# Altium footprint library Supernova.PcbLib: 77 footprints (part 2 of 6)
Each footprint in its own frame and in the unit in brackets; x right, y up, seen from the top. Pads: shape width x height; smd on the part's side, far side on the other; paste and mask are expansions set on the pad; w line width, h text height; cw(c..) or ccw(c..) is an arc to the next point about the centre after c.
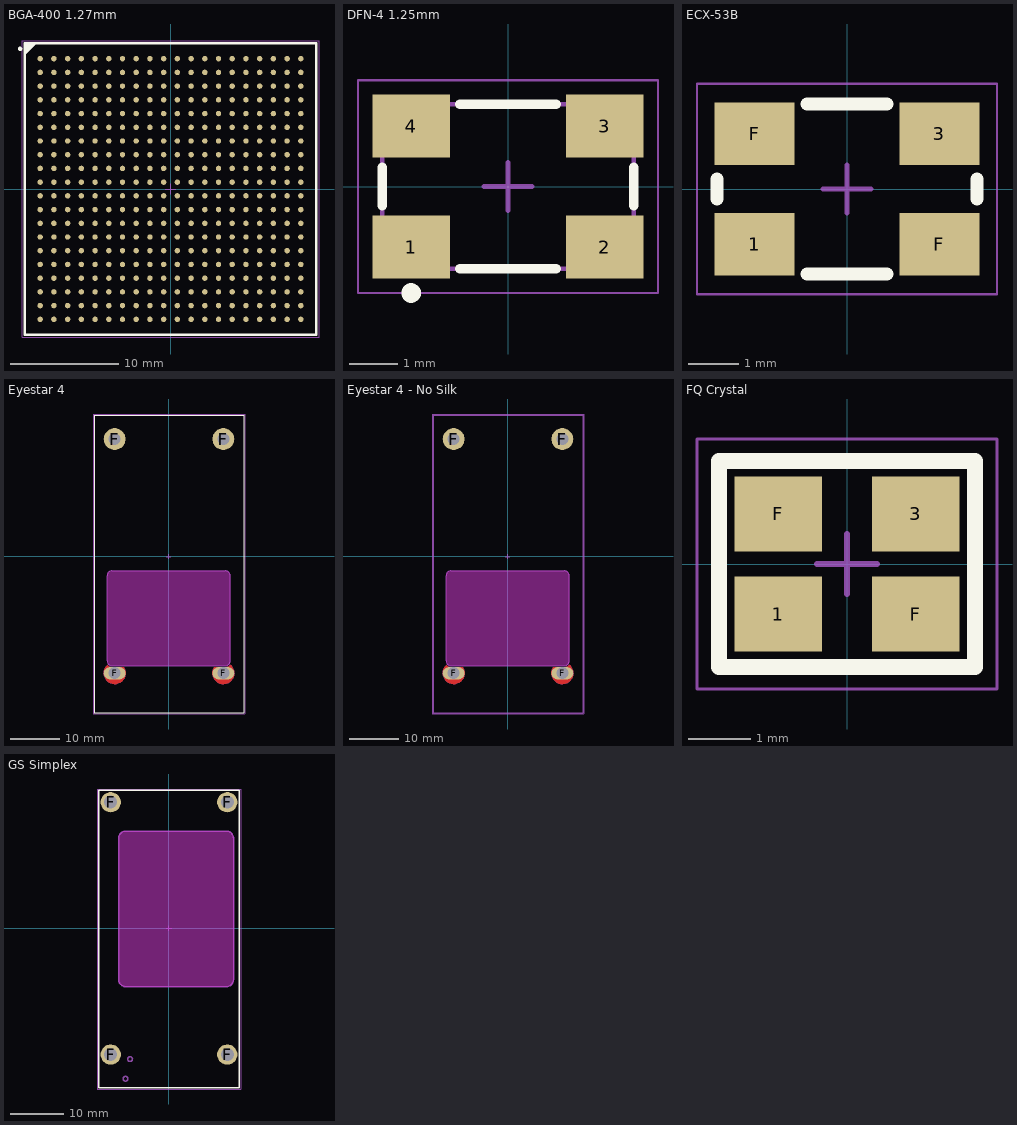
[diagram p1: the footprints below, top view; thin cyan lines are the x and y axes]

## BGA-400 1.27mm [mm] "BGA, 400-Leads, Body 27.00x27.00mmx2.60mm, Pitch 1.27mm"
height 2.6
pads (400):
  round 0.5 smd paste-0.04 mask+0.05: A1(-12.065,12.065) A2(-10.795,12.065) A3(-9.525,12.065) A4(-8.255,12.065) A5(-6.985,12.065) A6(-5.715,12.065) A7(-4.445,12.065) A8(-3.175,12.065) A9(-1.905,12.065) A10(-0.635,12.065) A11(0.635,12.065) A12(1.905,12.065) A13(3.175,12.065) A14(4.445,12.065) A15(5.715,12.065) A16(6.985,12.065) A17(8.255,12.065) A18(9.525,12.065) A19(10.795,12.065) A20(12.065,12.065) B1(-12.065,10.795) B2(-10.795,10.795) B3(-9.525,10.795) B4(-8.255,10.795) B5(-6.985,10.795) B6(-5.715,10.795) B7(-4.445,10.795) B8(-3.175,10.795) B9(-1.905,10.795) B10(-0.635,10.795) B11(0.635,10.795) B12(1.905,10.795) B13(3.175,10.795) B14(4.445,10.795) B15(5.715,10.795) B16(6.985,10.795) B17(8.255,10.795) B18(9.525,10.795) B19(10.795,10.795) B20(12.065,10.795) C1(-12.065,9.525) C2(-10.795,9.525) C3(-9.525,9.525) C4(-8.255,9.525) C5(-6.985,9.525) C6(-5.715,9.525) C7(-4.445,9.525) C8(-3.175,9.525) C9(-1.905,9.525) C10(-0.635,9.525) C11(0.635,9.525) C12(1.905,9.525) C13(3.175,9.525) C14(4.445,9.525) C15(5.715,9.525) C16(6.985,9.525) C17(8.255,9.525) C18(9.525,9.525) C19(10.795,9.525) C20(12.065,9.525) D1(-12.065,8.255) D2(-10.795,8.255) D3(-9.525,8.255) D4(-8.255,8.255) D5(-6.985,8.255) D6(-5.715,8.255) D7(-4.445,8.255) D8(-3.175,8.255) D9(-1.905,8.255) D10(-0.635,8.255) D11(0.635,8.255) D12(1.905,8.255) D13(3.175,8.255) D14(4.445,8.255) D15(5.715,8.255) D16(6.985,8.255) D17(8.255,8.255) D18(9.525,8.255) D19(10.795,8.255) D20(12.065,8.255) E1(-12.065,6.985) E2(-10.795,6.985) E3(-9.525,6.985) E4(-8.255,6.985) E5(-6.985,6.985) E6(-5.715,6.985) E7(-4.445,6.985) E8(-3.175,6.985) E9(-1.905,6.985) E10(-0.635,6.985) E11(0.635,6.985) E12(1.905,6.985) E13(3.175,6.985) E14(4.445,6.985) E15(5.715,6.985) E16(6.985,6.985) E17(8.255,6.985) E18(9.525,6.985) E19(10.795,6.985) E20(12.065,6.985) F1(-12.065,5.715) F2(-10.795,5.715) F3(-9.525,5.715) F4(-8.255,5.715) F5(-6.985,5.715) F6(-5.715,5.715) F7(-4.445,5.715) F8(-3.175,5.715) F9(-1.905,5.715) F10(-0.635,5.715) F11(0.635,5.715) F12(1.905,5.715) F13(3.175,5.715) F14(4.445,5.715) F15(5.715,5.715) F16(6.985,5.715) F17(8.255,5.715) F18(9.525,5.715) F19(10.795,5.715) F20(12.065,5.715) G1(-12.065,4.445) G2(-10.795,4.445) G3(-9.525,4.445) G4(-8.255,4.445) G5(-6.985,4.445) G6(-5.715,4.445) G7(-4.445,4.445) G8(-3.175,4.445) G9(-1.905,4.445) G10(-0.635,4.445) G11(0.635,4.445) G12(1.905,4.445) G13(3.175,4.445) G14(4.445,4.445) G15(5.715,4.445) G16(6.985,4.445) G17(8.255,4.445) G18(9.525,4.445) G19(10.795,4.445) G20(12.065,4.445) H1(-12.065,3.175) H2(-10.795,3.175) H3(-9.525,3.175) H4(-8.255,3.175) H5(-6.985,3.175) H6(-5.715,3.175) H7(-4.445,3.175) H8(-3.175,3.175) H9(-1.905,3.175) H10(-0.635,3.175) H11(0.635,3.175) H12(1.905,3.175) H13(3.175,3.175) H14(4.445,3.175) H15(5.715,3.175) H16(6.985,3.175) H17(8.255,3.175) H18(9.525,3.175) H19(10.795,3.175) H20(12.065,3.175) J1(-12.065,1.905) J2(-10.795,1.905) J3(-9.525,1.905) J4(-8.255,1.905) J5(-6.985,1.905) J6(-5.715,1.905) J7(-4.445,1.905) J8(-3.175,1.905) J9(-1.905,1.905) J10(-0.635,1.905) J11(0.635,1.905) J12(1.905,1.905) J13(3.175,1.905) J14(4.445,1.905) J15(5.715,1.905) J16(6.985,1.905) J17(8.255,1.905) J18(9.525,1.905) J19(10.795,1.905) J20(12.065,1.905) K1(-12.065,0.635) K2(-10.795,0.635) K3(-9.525,0.635) K4(-8.255,0.635) K5(-6.985,0.635) K6(-5.715,0.635) K7(-4.445,0.635) K8(-3.175,0.635) K9(-1.905,0.635) K10(-0.635,0.635) K11(0.635,0.635) K12(1.905,0.635) K13(3.175,0.635) K14(4.445,0.635) K15(5.715,0.635) K16(6.985,0.635) K17(8.255,0.635) K18(9.525,0.635) K19(10.795,0.635) K20(12.065,0.635) L1(-12.065,-0.635) L2(-10.795,-0.635) L3(-9.525,-0.635) L4(-8.255,-0.635) L5(-6.985,-0.635) L6(-5.715,-0.635) L7(-4.445,-0.635) L8(-3.175,-0.635) L9(-1.905,-0.635) L10(-0.635,-0.635) L11(0.635,-0.635) L12(1.905,-0.635) L13(3.175,-0.635) L14(4.445,-0.635) L15(5.715,-0.635) L16(6.985,-0.635) L17(8.255,-0.635) L18(9.525,-0.635) L19(10.795,-0.635) L20(12.065,-0.635) M1(-12.065,-1.905) M2(-10.795,-1.905) M3(-9.525,-1.905) M4(-8.255,-1.905) M5(-6.985,-1.905) M6(-5.715,-1.905) M7(-4.445,-1.905) M8(-3.175,-1.905) M9(-1.905,-1.905) M10(-0.635,-1.905) M11(0.635,-1.905) M12(1.905,-1.905) M13(3.175,-1.905) M14(4.445,-1.905) M15(5.715,-1.905) M16(6.985,-1.905) M17(8.255,-1.905) M18(9.525,-1.905) M19(10.795,-1.905) M20(12.065,-1.905) N1(-12.065,-3.175) N2(-10.795,-3.175) N3(-9.525,-3.175) N4(-8.255,-3.175) N5(-6.985,-3.175) N6(-5.715,-3.175) N7(-4.445,-3.175) N8(-3.175,-3.175) N9(-1.905,-3.175) N10(-0.635,-3.175) N11(0.635,-3.175) N12(1.905,-3.175) N13(3.175,-3.175) N14(4.445,-3.175) N15(5.715,-3.175) N16(6.985,-3.175) N17(8.255,-3.175) N18(9.525,-3.175) N19(10.795,-3.175) N20(12.065,-3.175) P1(-12.065,-4.445) P2(-10.795,-4.445) P3(-9.525,-4.445) P4(-8.255,-4.445) P5(-6.985,-4.445) P6(-5.715,-4.445) P7(-4.445,-4.445) P8(-3.175,-4.445) P9(-1.905,-4.445) P10(-0.635,-4.445) P11(0.635,-4.445) P12(1.905,-4.445) P13(3.175,-4.445) P14(4.445,-4.445) P15(5.715,-4.445) P16(6.985,-4.445) P17(8.255,-4.445) P18(9.525,-4.445) P19(10.795,-4.445) P20(12.065,-4.445) R1(-12.065,-5.715) R2(-10.795,-5.715) R3(-9.525,-5.715) R4(-8.255,-5.715) R5(-6.985,-5.715) R6(-5.715,-5.715) R7(-4.445,-5.715) R8(-3.175,-5.715) R9(-1.905,-5.715) R10(-0.635,-5.715) R11(0.635,-5.715) R12(1.905,-5.715) R13(3.175,-5.715) R14(4.445,-5.715) R15(5.715,-5.715) R16(6.985,-5.715) R17(8.255,-5.715) R18(9.525,-5.715) R19(10.795,-5.715) R20(12.065,-5.715) T1(-12.065,-6.985) T2(-10.795,-6.985) T3(-9.525,-6.985) T4(-8.255,-6.985) T5(-6.985,-6.985) T6(-5.715,-6.985) T7(-4.445,-6.985) T8(-3.175,-6.985) T9(-1.905,-6.985) T10(-0.635,-6.985) T11(0.635,-6.985) T12(1.905,-6.985) T13(3.175,-6.985) T14(4.445,-6.985) T15(5.715,-6.985) T16(6.985,-6.985) T17(8.255,-6.985) T18(9.525,-6.985) T19(10.795,-6.985) T20(12.065,-6.985) U1(-12.065,-8.255) U2(-10.795,-8.255) U3(-9.525,-8.255) U4(-8.255,-8.255) U5(-6.985,-8.255) U6(-5.715,-8.255) U7(-4.445,-8.255) U8(-3.175,-8.255) U9(-1.905,-8.255) U10(-0.635,-8.255) U11(0.635,-8.255) U12(1.905,-8.255) U13(3.175,-8.255) U14(4.445,-8.255) U15(5.715,-8.255) U16(6.985,-8.255) U17(8.255,-8.255) U18(9.525,-8.255) U19(10.795,-8.255) U20(12.065,-8.255) V1(-12.065,-9.525) V2(-10.795,-9.525) V3(-9.525,-9.525) V4(-8.255,-9.525) V5(-6.985,-9.525) V6(-5.715,-9.525) V7(-4.445,-9.525) V8(-3.175,-9.525) V9(-1.905,-9.525) V10(-0.635,-9.525) V11(0.635,-9.525) V12(1.905,-9.525) V13(3.175,-9.525) V14(4.445,-9.525) V15(5.715,-9.525) V16(6.985,-9.525) V17(8.255,-9.525) V18(9.525,-9.525) V19(10.795,-9.525) V20(12.065,-9.525) W1(-12.065,-10.795) W2(-10.795,-10.795) W3(-9.525,-10.795) W4(-8.255,-10.795) W5(-6.985,-10.795) W6(-5.715,-10.795) W7(-4.445,-10.795) W8(-3.175,-10.795) W9(-1.905,-10.795) W10(-0.635,-10.795) W11(0.635,-10.795) W12(1.905,-10.795) W13(3.175,-10.795) W14(4.445,-10.795) W15(5.715,-10.795) W16(6.985,-10.795) W17(8.255,-10.795) W18(9.525,-10.795) W19(10.795,-10.795) W20(12.065,-10.795) Y1(-12.065,-12.065) Y2(-10.795,-12.065) Y3(-9.525,-12.065) Y4(-8.255,-12.065) Y5(-6.985,-12.065) Y6(-5.715,-12.065) Y7(-4.445,-12.065) Y8(-3.175,-12.065) Y9(-1.905,-12.065) Y10(-0.635,-12.065) Y11(0.635,-12.065) Y12(1.905,-12.065) Y13(3.175,-12.065) Y14(4.445,-12.065) Y15(5.715,-12.065) Y16(6.985,-12.065) Y17(8.255,-12.065) Y18(9.525,-12.065) Y19(10.795,-12.065) Y20(12.065,-12.065)
Top Overlay:
  circle w0.203: c-13.927,12.98 r0.102
  region: -12.5,13.5 -13.5,12.5 -13.5,13.5
  lines w0.2: -13.5,12.5 -12.5,13.5 ; -13.5,-13.5 -13.5,13.5 13.5,13.5 13.5,-13.5 -13.5,-13.5
Top 3D Body:
  lines w0.1: -13.5,-13.5 -13.5,13.5 13.5,13.5 13.5,-13.5 -13.5,-13.5
Top Courtyard:
  lines w0.05: -13.75,-13.75 -13.75,13.75 13.75,13.75 13.75,-13.75 -13.75,-13.75
  lines w0.1: -0.5,0 0.5,0 ; 0,-0.5 0,0.5
3D body: height 0.75, standoff 0, extent 11.691,11.693 12.44,12.438
3D body: height 0.75, standoff 0, extent 7.881,11.693 8.63,12.438
3D body: height 0.75, standoff 0, extent 11.691,7.883 12.44,8.628
3D body: height 0.75, standoff 0, extent 7.881,7.883 8.63,8.628
3D body: height 0.75, standoff 0, extent 11.691,1.533 12.44,2.278
3D body: height 0.75, standoff 0, extent 7.881,1.533 8.63,2.278
3D body: height 0.75, standoff 0, extent 11.691,-2.277 12.44,-1.532
3D body: height 0.75, standoff 0, extent 7.881,-2.277 8.63,-1.532
3D body: height 0.75, standoff 0, extent 7.881,-8.627 8.63,-7.882
3D body: height 0.75, standoff 0, extent 11.691,-8.627 12.44,-7.882
3D body: height 0.75, standoff 0, extent 11.691,-12.437 12.44,-11.692
3D body: height 0.75, standoff 0, extent 7.881,-12.437 8.63,-11.692
3D body: height 0.75, standoff 0, extent 1.531,11.693 2.28,12.438
3D body: height 0.75, standoff 0, extent 1.531,7.883 2.28,8.628
3D body: height 0.75, standoff 0, extent 1.531,1.533 2.28,2.278
3D body: height 0.75, standoff 0, extent 1.531,-2.277 2.28,-1.532
3D body: height 0.75, standoff 0, extent 1.531,-8.627 2.28,-7.882
3D body: height 0.75, standoff 0, extent 1.531,-12.437 2.28,-11.692
3D body: height 0.75, standoff 0, extent -8.629,11.693 -7.88,12.438
3D body: height 0.75, standoff 0, extent -2.279,11.693 -1.53,12.438
3D body: height 0.75, standoff 0, extent -8.629,7.883 -7.88,8.628
3D body: height 0.75, standoff 0, extent -2.279,7.883 -1.53,8.628
3D body: height 0.75, standoff 0, extent -8.629,1.533 -7.88,2.278
3D body: height 0.75, standoff 0, extent -2.279,1.533 -1.53,2.278
3D body: height 0.75, standoff 0, extent -8.629,-2.277 -7.88,-1.532
3D body: height 0.75, standoff 0, extent -2.279,-2.277 -1.53,-1.532
3D body: height 0.75, standoff 0, extent -2.279,-8.627 -1.53,-7.882
3D body: height 0.75, standoff 0, extent -8.629,-8.627 -7.88,-7.882
3D body: height 0.75, standoff 0, extent -8.629,-12.437 -7.88,-11.692
3D body: height 0.75, standoff 0, extent -2.279,-12.437 -1.53,-11.692
3D body: height 0.75, standoff 0, extent -12.439,11.693 -11.69,12.438
3D body: height 0.75, standoff 0, extent -12.439,7.883 -11.69,8.628
3D body: height 0.75, standoff 0, extent -12.439,1.533 -11.69,2.278
3D body: height 0.75, standoff 0, extent -12.439,-2.277 -11.69,-1.532
3D body: height 0.75, standoff 0, extent -12.439,-8.627 -11.69,-7.882
3D body: height 0.75, standoff 0, extent -12.439,-12.437 -11.69,-11.692
3D body: height 0.75, standoff 0, extent 11.691,10.423 12.44,11.168
3D body: height 0.75, standoff 0, extent 7.881,10.423 8.63,11.168
3D body: height 0.75, standoff 0, extent 11.691,9.153 12.44,9.898
3D body: height 0.75, standoff 0, extent 7.881,9.153 8.63,9.898
3D body: height 0.75, standoff 0, extent 7.881,6.613 8.63,7.358
3D body: height 0.75, standoff 0, extent 11.691,6.613 12.44,7.358
3D body: height 0.75, standoff 0, extent 11.691,5.343 12.44,6.088
3D body: height 0.75, standoff 0, extent 7.881,5.343 8.63,6.088
3D body: height 0.75, standoff 0, extent 11.691,4.073 12.44,4.818
3D body: height 0.75, standoff 0, extent 7.881,4.073 8.63,4.818
3D body: height 0.75, standoff 0, extent 11.691,2.803 12.44,3.548
3D body: height 0.75, standoff 0, extent 7.881,2.803 8.63,3.548
3D body: height 0.75, standoff 0, extent 7.881,0.263 8.63,1.008
3D body: height 0.75, standoff 0, extent 11.691,0.263 12.44,1.008
3D body: height 0.75, standoff 0, extent 11.691,-1.007 12.44,-0.262
3D body: height 0.75, standoff 0, extent 7.881,-1.007 8.63,-0.262
3D body: height 0.75, standoff 0, extent 11.691,-3.547 12.44,-2.802
3D body: height 0.75, standoff 0, extent 7.881,-3.547 8.63,-2.802
3D body: height 0.75, standoff 0, extent 11.691,-4.817 12.44,-4.072
3D body: height 0.75, standoff 0, extent 7.881,-4.817 8.63,-4.072
3D body: height 0.75, standoff 0, extent 7.881,-6.087 8.63,-5.342
3D body: height 0.75, standoff 0, extent 11.691,-6.087 12.44,-5.342
3D body: height 0.75, standoff 0, extent 7.881,-7.357 8.63,-6.612
3D body: height 0.75, standoff 0, extent 11.691,-7.357 12.44,-6.612
3D body: height 0.75, standoff 0, extent 7.881,-9.897 8.63,-9.152
3D body: height 0.75, standoff 0, extent 11.691,-9.897 12.44,-9.152
3D body: height 0.75, standoff 0, extent 7.881,-11.167 8.63,-10.422
3D body: height 0.75, standoff 0, extent 11.691,-11.167 12.44,-10.422
3D body: height 0.75, standoff 0, extent 1.531,10.423 2.28,11.168
3D body: height 0.75, standoff 0, extent 1.531,9.153 2.28,9.898
3D body: height 0.75, standoff 0, extent 1.531,6.613 2.28,7.358
3D body: height 0.75, standoff 0, extent 1.531,5.343 2.28,6.088
3D body: height 0.75, standoff 0, extent 1.531,4.073 2.28,4.818
3D body: height 0.75, standoff 0, extent 1.531,2.803 2.28,3.548
3D body: height 0.75, standoff 0, extent 1.531,0.263 2.28,1.008
3D body: height 0.75, standoff 0, extent 1.531,-1.007 2.28,-0.262
3D body: height 0.75, standoff 0, extent 1.531,-3.547 2.28,-2.802
3D body: height 0.75, standoff 0, extent 1.531,-4.817 2.28,-4.072
3D body: height 0.75, standoff 0, extent 1.531,-6.087 2.28,-5.342
3D body: height 0.75, standoff 0, extent 1.531,-7.357 2.28,-6.612
3D body: height 0.75, standoff 0, extent 1.531,-9.897 2.28,-9.152
3D body: height 0.75, standoff 0, extent 1.531,-11.167 2.28,-10.422
3D body: height 0.75, standoff 0, extent -8.629,10.423 -7.88,11.168
3D body: height 0.75, standoff 0, extent -2.279,10.423 -1.53,11.168
3D body: height 0.75, standoff 0, extent -8.629,9.153 -7.88,9.898
3D body: height 0.75, standoff 0, extent -2.279,9.153 -1.53,9.898
3D body: height 0.75, standoff 0, extent -2.279,6.613 -1.53,7.358
3D body: height 0.75, standoff 0, extent -8.629,6.613 -7.88,7.358
3D body: height 0.75, standoff 0, extent -8.629,5.343 -7.88,6.088
3D body: height 0.75, standoff 0, extent -2.279,5.343 -1.53,6.088
3D body: height 0.75, standoff 0, extent -8.629,4.073 -7.88,4.818
3D body: height 0.75, standoff 0, extent -2.279,4.073 -1.53,4.818
3D body: height 0.75, standoff 0, extent -8.629,2.803 -7.88,3.548
3D body: height 0.75, standoff 0, extent -2.279,2.803 -1.53,3.548
3D body: height 0.75, standoff 0, extent -2.279,0.263 -1.53,1.008
3D body: height 0.75, standoff 0, extent -8.629,0.263 -7.88,1.008
3D body: height 0.75, standoff 0, extent -8.629,-1.007 -7.88,-0.262
3D body: height 0.75, standoff 0, extent -2.279,-1.007 -1.53,-0.262
3D body: height 0.75, standoff 0, extent -8.629,-3.547 -7.88,-2.802
3D body: height 0.75, standoff 0, extent -2.279,-3.547 -1.53,-2.802
3D body: height 0.75, standoff 0, extent -8.629,-4.817 -7.88,-4.072
3D body: height 0.75, standoff 0, extent -2.279,-4.817 -1.53,-4.072
3D body: height 0.75, standoff 0, extent -2.279,-6.087 -1.53,-5.342
3D body: height 0.75, standoff 0, extent -8.629,-6.087 -7.88,-5.342
3D body: height 0.75, standoff 0, extent -2.279,-7.357 -1.53,-6.612
3D body: height 0.75, standoff 0, extent -8.629,-7.357 -7.88,-6.612
3D body: height 0.75, standoff 0, extent -2.279,-9.897 -1.53,-9.152
3D body: height 0.75, standoff 0, extent -8.629,-9.897 -7.88,-9.152
3D body: height 0.75, standoff 0, extent -2.279,-11.167 -1.53,-10.422
3D body: height 0.75, standoff 0, extent -8.629,-11.167 -7.88,-10.422
3D body: height 0.75, standoff 0, extent -12.439,10.423 -11.69,11.168
3D body: height 0.75, standoff 0, extent -12.439,9.153 -11.69,9.898
3D body: height 0.75, standoff 0, extent -12.439,6.613 -11.69,7.358
3D body: height 0.75, standoff 0, extent -12.439,5.343 -11.69,6.088
3D body: height 0.75, standoff 0, extent -12.439,4.073 -11.69,4.818
3D body: height 0.75, standoff 0, extent -12.439,2.803 -11.69,3.548
3D body: height 0.75, standoff 0, extent -12.439,0.263 -11.69,1.008
3D body: height 0.75, standoff 0, extent -12.439,-1.007 -11.69,-0.262
3D body: height 0.75, standoff 0, extent -12.439,-3.547 -11.69,-2.802
3D body: height 0.75, standoff 0, extent -12.439,-4.817 -11.69,-4.072
3D body: height 0.75, standoff 0, extent -12.439,-6.087 -11.69,-5.342
3D body: height 0.75, standoff 0, extent -12.439,-7.357 -11.69,-6.612
3D body: height 0.75, standoff 0, extent -12.439,-9.897 -11.69,-9.152
3D body: height 0.75, standoff 0, extent -12.439,-11.167 -11.69,-10.422
3D body: height 0.75, standoff 0, extent 10.421,11.693 11.17,12.438
3D body: height 0.75, standoff 0, extent 10.421,7.883 11.17,8.628
3D body: height 0.75, standoff 0, extent 10.421,1.533 11.17,2.278
3D body: height 0.75, standoff 0, extent 10.421,-2.277 11.17,-1.532
3D body: height 0.75, standoff 0, extent 10.421,-8.627 11.17,-7.882
3D body: height 0.75, standoff 0, extent 10.421,-12.437 11.17,-11.692
3D body: height 0.75, standoff 0, extent 9.151,11.693 9.9,12.438
3D body: height 0.75, standoff 0, extent 9.151,7.883 9.9,8.628
3D body: height 0.75, standoff 0, extent 9.151,1.533 9.9,2.278
3D body: height 0.75, standoff 0, extent 9.151,-2.277 9.9,-1.532
3D body: height 0.75, standoff 0, extent 9.151,-8.627 9.9,-7.882
3D body: height 0.75, standoff 0, extent 9.151,-12.437 9.9,-11.692
3D body: height 0.75, standoff 0, extent 6.611,11.693 7.36,12.438
3D body: height 0.75, standoff 0, extent 6.611,7.883 7.36,8.628
3D body: height 0.75, standoff 0, extent 6.611,1.533 7.36,2.278
3D body: height 0.75, standoff 0, extent 6.611,-2.277 7.36,-1.532
3D body: height 0.75, standoff 0, extent 6.611,-8.627 7.36,-7.882
3D body: height 0.75, standoff 0, extent 6.611,-12.437 7.36,-11.692
3D body: height 0.75, standoff 0, extent 5.341,11.693 6.09,12.438
3D body: height 0.75, standoff 0, extent 4.071,11.693 4.82,12.438
3D body: height 0.75, standoff 0, extent 5.341,7.883 6.09,8.628
3D body: height 0.75, standoff 0, extent 4.071,7.883 4.82,8.628
3D body: height 0.75, standoff 0, extent 5.341,1.533 6.09,2.278
3D body: height 0.75, standoff 0, extent 4.071,1.533 4.82,2.278
3D body: height 0.75, standoff 0, extent 5.341,-2.277 6.09,-1.532
3D body: height 0.75, standoff 0, extent 4.071,-2.277 4.82,-1.532
3D body: height 0.75, standoff 0, extent 4.071,-8.627 4.82,-7.882
3D body: height 0.75, standoff 0, extent 5.341,-8.627 6.09,-7.882
3D body: height 0.75, standoff 0, extent 5.341,-12.437 6.09,-11.692
3D body: height 0.75, standoff 0, extent 4.071,-12.437 4.82,-11.692
3D body: height 0.75, standoff 0, extent 2.801,11.693 3.55,12.438
3D body: height 0.75, standoff 0, extent 2.801,7.883 3.55,8.628
3D body: height 0.75, standoff 0, extent 2.801,1.533 3.55,2.278
3D body: height 0.75, standoff 0, extent 2.801,-2.277 3.55,-1.532
3D body: height 0.75, standoff 0, extent 2.801,-8.627 3.55,-7.882
3D body: height 0.75, standoff 0, extent 2.801,-12.437 3.55,-11.692
3D body: height 0.75, standoff 0, extent 0.261,11.693 1.01,12.438
3D body: height 0.75, standoff 0, extent 0.261,7.883 1.01,8.628
3D body: height 0.75, standoff 0, extent 0.261,1.533 1.01,2.278
3D body: height 0.75, standoff 0, extent 0.261,-2.277 1.01,-1.532
3D body: height 0.75, standoff 0, extent 0.261,-8.627 1.01,-7.882
3D body: height 0.75, standoff 0, extent 0.261,-12.437 1.01,-11.692
3D body: height 0.75, standoff 0, extent -1.009,11.693 -0.26,12.438
3D body: height 0.75, standoff 0, extent -1.009,7.883 -0.26,8.628
3D body: height 0.75, standoff 0, extent -1.009,1.533 -0.26,2.278
3D body: height 0.75, standoff 0, extent -1.009,-2.277 -0.26,-1.532
3D body: height 0.75, standoff 0, extent -1.009,-8.627 -0.26,-7.882
3D body: height 0.75, standoff 0, extent -1.009,-12.437 -0.26,-11.692
3D body: height 0.75, standoff 0, extent -3.549,11.693 -2.8,12.438
3D body: height 0.75, standoff 0, extent -3.549,7.883 -2.8,8.628
3D body: height 0.75, standoff 0, extent -3.549,1.533 -2.8,2.278
3D body: height 0.75, standoff 0, extent -3.549,-2.277 -2.8,-1.532
3D body: height 0.75, standoff 0, extent -3.549,-8.627 -2.8,-7.882
3D body: height 0.75, standoff 0, extent -3.549,-12.437 -2.8,-11.692
3D body: height 0.75, standoff 0, extent -4.819,11.693 -4.07,12.438
3D body: height 0.75, standoff 0, extent -6.089,11.693 -5.34,12.438
3D body: height 0.75, standoff 0, extent -4.819,7.883 -4.07,8.628
3D body: height 0.75, standoff 0, extent -6.089,7.883 -5.34,8.628
3D body: height 0.75, standoff 0, extent -4.819,1.533 -4.07,2.278
3D body: height 0.75, standoff 0, extent -6.089,1.533 -5.34,2.278
3D body: height 0.75, standoff 0, extent -4.819,-2.277 -4.07,-1.532
3D body: height 0.75, standoff 0, extent -6.089,-2.277 -5.34,-1.532
3D body: height 0.75, standoff 0, extent -6.089,-8.627 -5.34,-7.882
3D body: height 0.75, standoff 0, extent -4.819,-8.627 -4.07,-7.882
3D body: height 0.75, standoff 0, extent -4.819,-12.437 -4.07,-11.692
3D body: height 0.75, standoff 0, extent -6.089,-12.437 -5.34,-11.692
3D body: height 0.75, standoff 0, extent -7.359,11.693 -6.61,12.438
3D body: height 0.75, standoff 0, extent -7.359,7.883 -6.61,8.628
3D body: height 0.75, standoff 0, extent -7.359,1.533 -6.61,2.278
3D body: height 0.75, standoff 0, extent -7.359,-2.277 -6.61,-1.532
3D body: height 0.75, standoff 0, extent -7.359,-8.627 -6.61,-7.882
3D body: height 0.75, standoff 0, extent -7.359,-12.437 -6.61,-11.692
3D body: height 0.75, standoff 0, extent -9.899,11.693 -9.15,12.438
3D body: height 0.75, standoff 0, extent -9.899,7.883 -9.15,8.628
3D body: height 0.75, standoff 0, extent -9.899,1.533 -9.15,2.278
3D body: height 0.75, standoff 0, extent -9.899,-2.277 -9.15,-1.532
3D body: height 0.75, standoff 0, extent -9.899,-8.627 -9.15,-7.882
3D body: height 0.75, standoff 0, extent -9.899,-12.437 -9.15,-11.692
3D body: height 0.75, standoff 0, extent -11.169,11.693 -10.42,12.438
3D body: height 0.75, standoff 0, extent -11.169,7.883 -10.42,8.628
3D body: height 0.75, standoff 0, extent -11.169,1.533 -10.42,2.278
3D body: height 0.75, standoff 0, extent -11.169,-2.277 -10.42,-1.532
3D body: height 0.75, standoff 0, extent -11.169,-8.627 -10.42,-7.882
3D body: height 0.75, standoff 0, extent -11.169,-12.437 -10.42,-11.692
3D body: height 0.75, standoff 0, extent 10.421,10.423 11.17,11.168
3D body: height 0.75, standoff 0, extent 10.421,9.153 11.17,9.898
3D body: height 0.75, standoff 0, extent 10.421,6.613 11.17,7.358
3D body: height 0.75, standoff 0, extent 10.421,5.343 11.17,6.088
3D body: height 0.75, standoff 0, extent 10.421,4.073 11.17,4.818
3D body: height 0.75, standoff 0, extent 10.421,2.803 11.17,3.548
3D body: height 0.75, standoff 0, extent 10.421,0.263 11.17,1.008
3D body: height 0.75, standoff 0, extent 10.421,-1.007 11.17,-0.262
3D body: height 0.75, standoff 0, extent 10.421,-3.547 11.17,-2.802
3D body: height 0.75, standoff 0, extent 10.421,-4.817 11.17,-4.072
3D body: height 0.75, standoff 0, extent 10.421,-6.087 11.17,-5.342
3D body: height 0.75, standoff 0, extent 10.421,-7.357 11.17,-6.612
3D body: height 0.75, standoff 0, extent 10.421,-9.897 11.17,-9.152
3D body: height 0.75, standoff 0, extent 10.421,-11.167 11.17,-10.422
3D body: height 0.75, standoff 0, extent 9.151,10.423 9.9,11.168
3D body: height 0.75, standoff 0, extent 9.151,9.153 9.9,9.898
3D body: height 0.75, standoff 0, extent 9.151,6.613 9.9,7.358
3D body: height 0.75, standoff 0, extent 9.151,5.343 9.9,6.088
3D body: height 0.75, standoff 0, extent 9.151,4.073 9.9,4.818
3D body: height 0.75, standoff 0, extent 9.151,2.803 9.9,3.548
3D body: height 0.75, standoff 0, extent 9.151,0.263 9.9,1.008
3D body: height 0.75, standoff 0, extent 9.151,-1.007 9.9,-0.262
3D body: height 0.75, standoff 0, extent 9.151,-3.547 9.9,-2.802
3D body: height 0.75, standoff 0, extent 9.151,-4.817 9.9,-4.072
3D body: height 0.75, standoff 0, extent 9.151,-6.087 9.9,-5.342
3D body: height 0.75, standoff 0, extent 9.151,-7.357 9.9,-6.612
3D body: height 0.75, standoff 0, extent 9.151,-9.897 9.9,-9.152
3D body: height 0.75, standoff 0, extent 9.151,-11.167 9.9,-10.422
3D body: height 0.75, standoff 0, extent 6.611,10.423 7.36,11.168
3D body: height 0.75, standoff 0, extent 6.611,9.153 7.36,9.898
3D body: height 0.75, standoff 0, extent 6.611,6.613 7.36,7.358
3D body: height 0.75, standoff 0, extent 6.611,5.343 7.36,6.088
3D body: height 0.75, standoff 0, extent 6.611,4.073 7.36,4.818
3D body: height 0.75, standoff 0, extent 6.611,2.803 7.36,3.548
3D body: height 0.75, standoff 0, extent 6.611,0.263 7.36,1.008
3D body: height 0.75, standoff 0, extent 6.611,-1.007 7.36,-0.262
3D body: height 0.75, standoff 0, extent 6.611,-3.547 7.36,-2.802
3D body: height 0.75, standoff 0, extent 6.611,-4.817 7.36,-4.072
3D body: height 0.75, standoff 0, extent 6.611,-6.087 7.36,-5.342
3D body: height 0.75, standoff 0, extent 6.611,-7.357 7.36,-6.612
3D body: height 0.75, standoff 0, extent 6.611,-9.897 7.36,-9.152
3D body: height 0.75, standoff 0, extent 6.611,-11.167 7.36,-10.422
3D body: height 0.75, standoff 0, extent 5.341,10.423 6.09,11.168
3D body: height 0.75, standoff 0, extent 4.071,10.423 4.82,11.168
3D body: height 0.75, standoff 0, extent 5.341,9.153 6.09,9.898
3D body: height 0.75, standoff 0, extent 4.071,9.153 4.82,9.898
3D body: height 0.75, standoff 0, extent 4.071,6.613 4.82,7.358
3D body: height 0.75, standoff 0, extent 5.341,6.613 6.09,7.358
3D body: height 0.75, standoff 0, extent 5.341,5.343 6.09,6.088
3D body: height 0.75, standoff 0, extent 4.071,5.343 4.82,6.088
3D body: height 0.75, standoff 0, extent 5.341,4.073 6.09,4.818
3D body: height 0.75, standoff 0, extent 4.071,4.073 4.82,4.818
3D body: height 0.75, standoff 0, extent 5.341,2.803 6.09,3.548
3D body: height 0.75, standoff 0, extent 4.071,2.803 4.82,3.548
3D body: height 0.75, standoff 0, extent 4.071,0.263 4.82,1.008
3D body: height 0.75, standoff 0, extent 5.341,0.263 6.09,1.008
3D body: height 0.75, standoff 0, extent 5.341,-1.007 6.09,-0.262
3D body: height 0.75, standoff 0, extent 4.071,-1.007 4.82,-0.262
3D body: height 0.75, standoff 0, extent 5.341,-3.547 6.09,-2.802
3D body: height 0.75, standoff 0, extent 4.071,-3.547 4.82,-2.802
3D body: height 0.75, standoff 0, extent 5.341,-4.817 6.09,-4.072
3D body: height 0.75, standoff 0, extent 4.071,-4.817 4.82,-4.072
3D body: height 0.75, standoff 0, extent 4.071,-6.087 4.82,-5.342
3D body: height 0.75, standoff 0, extent 5.341,-6.087 6.09,-5.342
3D body: height 0.75, standoff 0, extent 4.071,-7.357 4.82,-6.612
3D body: height 0.75, standoff 0, extent 5.341,-7.357 6.09,-6.612
3D body: height 0.75, standoff 0, extent 4.071,-9.897 4.82,-9.152
3D body: height 0.75, standoff 0, extent 5.341,-9.897 6.09,-9.152
3D body: height 0.75, standoff 0, extent 4.071,-11.167 4.82,-10.422
3D body: height 0.75, standoff 0, extent 5.341,-11.167 6.09,-10.422
3D body: height 0.75, standoff 0, extent 2.801,10.423 3.55,11.168
3D body: height 0.75, standoff 0, extent 2.801,9.153 3.55,9.898
3D body: height 0.75, standoff 0, extent 2.801,6.613 3.55,7.358
3D body: height 0.75, standoff 0, extent 2.801,5.343 3.55,6.088
3D body: height 0.75, standoff 0, extent 2.801,4.073 3.55,4.818
3D body: height 0.75, standoff 0, extent 2.801,2.803 3.55,3.548
3D body: height 0.75, standoff 0, extent 2.801,0.263 3.55,1.008
3D body: height 0.75, standoff 0, extent 2.801,-1.007 3.55,-0.262
3D body: height 0.75, standoff 0, extent 2.801,-3.547 3.55,-2.802
3D body: height 0.75, standoff 0, extent 2.801,-4.817 3.55,-4.072
3D body: height 0.75, standoff 0, extent 2.801,-6.087 3.55,-5.342
3D body: height 0.75, standoff 0, extent 2.801,-7.357 3.55,-6.612
3D body: height 0.75, standoff 0, extent 2.801,-9.897 3.55,-9.152
3D body: height 0.75, standoff 0, extent 2.801,-11.167 3.55,-10.422
3D body: height 0.75, standoff 0, extent 0.261,10.423 1.01,11.168
3D body: height 0.75, standoff 0, extent 0.261,9.153 1.01,9.898
3D body: height 0.75, standoff 0, extent 0.261,6.613 1.01,7.358
3D body: height 0.75, standoff 0, extent 0.261,5.343 1.01,6.088
3D body: height 0.75, standoff 0, extent 0.261,4.073 1.01,4.818
3D body: height 0.75, standoff 0, extent 0.261,2.803 1.01,3.548
3D body: height 0.75, standoff 0, extent 0.261,0.263 1.01,1.008
3D body: height 0.75, standoff 0, extent 0.261,-1.007 1.01,-0.262
3D body: height 0.75, standoff 0, extent 0.261,-3.547 1.01,-2.802
3D body: height 0.75, standoff 0, extent 0.261,-4.817 1.01,-4.072
3D body: height 0.75, standoff 0, extent 0.261,-6.087 1.01,-5.342
3D body: height 0.75, standoff 0, extent 0.261,-7.357 1.01,-6.612
3D body: height 0.75, standoff 0, extent 0.261,-9.897 1.01,-9.152
3D body: height 0.75, standoff 0, extent 0.261,-11.167 1.01,-10.422
3D body: height 0.75, standoff 0, extent -1.009,10.423 -0.26,11.168
3D body: height 0.75, standoff 0, extent -1.009,9.153 -0.26,9.898
3D body: height 0.75, standoff 0, extent -1.009,6.613 -0.26,7.358
3D body: height 0.75, standoff 0, extent -1.009,5.343 -0.26,6.088
3D body: height 0.75, standoff 0, extent -1.009,4.073 -0.26,4.818
3D body: height 0.75, standoff 0, extent -1.009,2.803 -0.26,3.548
3D body: height 0.75, standoff 0, extent -1.009,0.263 -0.26,1.008
3D body: height 0.75, standoff 0, extent -1.009,-1.007 -0.26,-0.262
3D body: height 0.75, standoff 0, extent -1.009,-3.547 -0.26,-2.802
3D body: height 0.75, standoff 0, extent -1.009,-4.817 -0.26,-4.072
3D body: height 0.75, standoff 0, extent -1.009,-6.087 -0.26,-5.342
3D body: height 0.75, standoff 0, extent -1.009,-7.357 -0.26,-6.612
3D body: height 0.75, standoff 0, extent -1.009,-9.897 -0.26,-9.152
3D body: height 0.75, standoff 0, extent -1.009,-11.167 -0.26,-10.422
3D body: height 0.75, standoff 0, extent -3.549,10.423 -2.8,11.168
3D body: height 0.75, standoff 0, extent -3.549,9.153 -2.8,9.898
3D body: height 0.75, standoff 0, extent -3.549,6.613 -2.8,7.358
3D body: height 0.75, standoff 0, extent -3.549,5.343 -2.8,6.088
3D body: height 0.75, standoff 0, extent -3.549,4.073 -2.8,4.818
3D body: height 0.75, standoff 0, extent -3.549,2.803 -2.8,3.548
3D body: height 0.75, standoff 0, extent -3.549,0.263 -2.8,1.008
3D body: height 0.75, standoff 0, extent -3.549,-1.007 -2.8,-0.262
3D body: height 0.75, standoff 0, extent -3.549,-3.547 -2.8,-2.802
3D body: height 0.75, standoff 0, extent -3.549,-4.817 -2.8,-4.072
3D body: height 0.75, standoff 0, extent -3.549,-6.087 -2.8,-5.342
3D body: height 0.75, standoff 0, extent -3.549,-7.357 -2.8,-6.612
3D body: height 0.75, standoff 0, extent -3.549,-9.897 -2.8,-9.152
3D body: height 0.75, standoff 0, extent -3.549,-11.167 -2.8,-10.422
3D body: height 0.75, standoff 0, extent -4.819,10.423 -4.07,11.168
3D body: height 0.75, standoff 0, extent -6.089,10.423 -5.34,11.168
3D body: height 0.75, standoff 0, extent -4.819,9.153 -4.07,9.898
3D body: height 0.75, standoff 0, extent -6.089,9.153 -5.34,9.898
3D body: height 0.75, standoff 0, extent -6.089,6.613 -5.34,7.358
3D body: height 0.75, standoff 0, extent -4.819,6.613 -4.07,7.358
3D body: height 0.75, standoff 0, extent -4.819,5.343 -4.07,6.088
3D body: height 0.75, standoff 0, extent -6.089,5.343 -5.34,6.088
3D body: height 0.75, standoff 0, extent -4.819,4.073 -4.07,4.818
3D body: height 0.75, standoff 0, extent -6.089,4.073 -5.34,4.818
3D body: height 0.75, standoff 0, extent -4.819,2.803 -4.07,3.548
3D body: height 0.75, standoff 0, extent -6.089,2.803 -5.34,3.548
3D body: height 0.75, standoff 0, extent -6.089,0.263 -5.34,1.008
3D body: height 0.75, standoff 0, extent -4.819,0.263 -4.07,1.008
3D body: height 0.75, standoff 0, extent -4.819,-1.007 -4.07,-0.262
3D body: height 0.75, standoff 0, extent -6.089,-1.007 -5.34,-0.262
3D body: height 0.75, standoff 0, extent -4.819,-3.547 -4.07,-2.802
3D body: height 0.75, standoff 0, extent -6.089,-3.547 -5.34,-2.802
3D body: height 0.75, standoff 0, extent -4.819,-4.817 -4.07,-4.072
3D body: height 0.75, standoff 0, extent -6.089,-4.817 -5.34,-4.072
3D body: height 0.75, standoff 0, extent -6.089,-6.087 -5.34,-5.342
3D body: height 0.75, standoff 0, extent -4.819,-6.087 -4.07,-5.342
3D body: height 0.75, standoff 0, extent -6.089,-7.357 -5.34,-6.612
3D body: height 0.75, standoff 0, extent -4.819,-7.357 -4.07,-6.612
3D body: height 0.75, standoff 0, extent -6.089,-9.897 -5.34,-9.152
3D body: height 0.75, standoff 0, extent -4.819,-9.897 -4.07,-9.152
3D body: height 0.75, standoff 0, extent -6.089,-11.167 -5.34,-10.422
3D body: height 0.75, standoff 0, extent -4.819,-11.167 -4.07,-10.422
3D body: height 0.75, standoff 0, extent -7.359,10.423 -6.61,11.168
3D body: height 0.75, standoff 0, extent -7.359,9.153 -6.61,9.898
3D body: height 0.75, standoff 0, extent -7.359,6.613 -6.61,7.358
3D body: height 0.75, standoff 0, extent -7.359,5.343 -6.61,6.088
3D body: height 0.75, standoff 0, extent -7.359,4.073 -6.61,4.818
3D body: height 0.75, standoff 0, extent -7.359,2.803 -6.61,3.548
3D body: height 0.75, standoff 0, extent -7.359,0.263 -6.61,1.008
3D body: height 0.75, standoff 0, extent -7.359,-1.007 -6.61,-0.262
3D body: height 0.75, standoff 0, extent -7.359,-3.547 -6.61,-2.802
3D body: height 0.75, standoff 0, extent -7.359,-4.817 -6.61,-4.072
3D body: height 0.75, standoff 0, extent -7.359,-6.087 -6.61,-5.342
3D body: height 0.75, standoff 0, extent -7.359,-7.357 -6.61,-6.612
3D body: height 0.75, standoff 0, extent -7.359,-9.897 -6.61,-9.152
3D body: height 0.75, standoff 0, extent -7.359,-11.167 -6.61,-10.422
3D body: height 0.75, standoff 0, extent -9.899,10.423 -9.15,11.168
3D body: height 0.75, standoff 0, extent -9.899,9.153 -9.15,9.898
3D body: height 0.75, standoff 0, extent -9.899,6.613 -9.15,7.358
3D body: height 0.75, standoff 0, extent -9.899,5.343 -9.15,6.088
3D body: height 0.75, standoff 0, extent -9.899,4.073 -9.15,4.818
3D body: height 0.75, standoff 0, extent -9.899,2.803 -9.15,3.548
3D body: height 0.75, standoff 0, extent -9.899,0.263 -9.15,1.008
3D body: height 0.75, standoff 0, extent -9.899,-1.007 -9.15,-0.262
3D body: height 0.75, standoff 0, extent -9.899,-3.547 -9.15,-2.802
3D body: height 0.75, standoff 0, extent -9.899,-4.817 -9.15,-4.072
3D body: height 0.75, standoff 0, extent -9.899,-6.087 -9.15,-5.342
3D body: height 0.75, standoff 0, extent -9.899,-7.357 -9.15,-6.612
3D body: height 0.75, standoff 0, extent -9.899,-9.897 -9.15,-9.152
3D body: height 0.75, standoff 0, extent -9.899,-11.167 -9.15,-10.422
3D body: height 0.75, standoff 0, extent -11.169,10.423 -10.42,11.168
3D body: height 0.75, standoff 0, extent -11.169,9.153 -10.42,9.898
3D body: height 0.75, standoff 0, extent -11.169,6.613 -10.42,7.358
3D body: height 0.75, standoff 0, extent -11.169,5.343 -10.42,6.088
3D body: height 0.75, standoff 0, extent -11.169,4.073 -10.42,4.818
3D body: height 0.75, standoff 0, extent -11.169,2.803 -10.42,3.548
3D body: height 0.75, standoff 0, extent -11.169,0.263 -10.42,1.008
3D body: height 0.75, standoff 0, extent -11.169,-1.007 -10.42,-0.262
3D body: height 0.75, standoff 0, extent -11.169,-3.547 -10.42,-2.802
3D body: height 0.75, standoff 0, extent -11.169,-4.817 -10.42,-4.072
3D body: height 0.75, standoff 0, extent -11.169,-6.087 -10.42,-5.342
3D body: height 0.75, standoff 0, extent -11.169,-7.357 -10.42,-6.612
3D body: height 0.75, standoff 0, extent -11.169,-9.897 -10.42,-9.152
3D body: height 0.75, standoff 0, extent -11.169,-11.167 -10.42,-10.422
3D body: height 2.6, standoff 0.5, extent -13.5,-13.5 13.5,13.5

## DFN-4 1.25mm [mm] "DFN, 4-Leads, Body 3.20x5.00mm, Pitch 1.25mm, IPC Medium Density"
height 1.5
pads (4):
  rect 1.6x1.3 smd: 1(-2,-1.25) 2(2,-1.25) 3(2,1.25) 4(-2,1.25)
Top Overlay:
  circle w0.203: c-2,-2.2 r0.102
  lines w0.2: -2.6,-0.4 -2.6,0.4 ; -1,-1.7 1,-1.7 ; -1,1.7 1,1.7 ; 2.6,-0.4 2.6,0.4
Top 3D Body:
  lines w0.1: -2.6,-1.7 -2.6,1.7 2.6,1.7 2.6,-1.7 -2.6,-1.7
Top Courtyard:
  lines w0.05: -3.1,-2.2 -3.1,2.2 3.1,2.2 3.1,-2.2 -3.1,-2.2
  lines w0.1: -0.5,0 0.5,0 ; 0,-0.5 0,0.5
3D body: height 1.5, standoff 0, extent -2.6,-1.7 2.6,1.7

## ECX-53B [mm]
pads (4):
  rect 1.6x1.25 smd: 1(-1.85,-1.1) 3(1.85,1.1) F(-1.85,1.1) F(1.85,-1.1)
Top Overlay:
  lines w0.254: -2.6,-0.2 -2.6,0.2 ; -0.8,-1.7 0.8,-1.7 ; -0.8,1.7 0.8,1.7 ; 2.6,-0.2 2.6,0.2
Top Courtyard:
  lines w0.05: -3,-2.1 -3,2.1 3,2.1 3,-2.1 -3,-2.1
  lines w0.1: -0.48,0 0.48,0 ; 0,-0.48 0,0.48
3D body: height 0.8, standoff 0.5, extent -2.4,-1.5 2.4,1.5
3D body: height 0.5, standoff 0.1, extent -2.5,-1.6 2.5,1.6
3D body: height 0.85, standoff 0.8, extent -2.3,-1.4 2.3,1.4

## Eyestar 4 [mil]
pads (4):
  oval 175x98 hole 96: F(-435,-937) F(435,-937)
  round 175 hole 96: F(-435,937) F(435,937)
Top Layer:
  region: 362.51,-888 357.77,-895.01 351.15,-910.6 347.64,-927.16 347.38,-944.09 350.36,-960.76 356.49,-976.55 365.53,-990.86 377.14,-1003.18 390.9,-1013.05 406.3,-1020.09 422.76,-1024.05 439.68,-1024.78 456.42,-1022.26 472.37,-1016.57 486.93,-1007.93 499.56,-996.66 509.8,-983.18 517.27,-967.98 521.68,-951.63 522.88,-934.74 520.82,-917.94 515.57,-901.84 507.33,-887.04 496.42,-874.1 489.82,-868.8 486.14,-873.05 477.46,-880.17 467.39,-885.13 456.45,-887.68 450.84,-888
  region: -493.28,-871.73 -499.52,-877.31 -509.67,-890.62 -517.11,-905.62 -521.57,-921.76 -522.89,-938.45 -521.02,-955.08 -516.03,-971.06 -508.1,-985.81 -497.52,-998.78 -484.68,-1009.52 -470.03,-1017.62 -454.11,-1022.8 -437.49,-1024.86 -420.79,-1023.74 -404.6,-1019.48 -389.52,-1012.22 -376.08,-1002.23 -364.78,-989.88 -356.03,-975.61 -350.15,-959.93 -347.34,-943.43 -347.71,-926.69 -351.24,-910.33 -357.82,-894.93 -362.51,-888 -456.83,-888 -456.83,-887.9 -461.96,-887.63 -471.98,-885.51 -481.34,-881.35 -489.64,-875.35
Bottom Layer:
  region: 362.51,-888 357.77,-895.01 351.15,-910.6 347.64,-927.16 347.38,-944.09 350.36,-960.76 356.49,-976.55 365.53,-990.86 377.14,-1003.18 390.9,-1013.05 406.3,-1020.09 422.76,-1024.05 439.68,-1024.78 456.42,-1022.26 472.37,-1016.57 486.93,-1007.93 499.56,-996.66 509.8,-983.18 517.27,-967.98 521.68,-951.63 522.88,-934.74 520.82,-917.94 515.57,-901.84 507.33,-887.04 496.42,-874.1 489.82,-868.8 486.14,-873.05 477.46,-880.17 467.39,-885.13 456.45,-887.68 450.84,-888
  region: -493.28,-871.73 -499.52,-877.31 -509.67,-890.62 -517.11,-905.62 -521.57,-921.76 -522.89,-938.45 -521.02,-955.08 -516.03,-971.06 -508.1,-985.81 -497.52,-998.78 -484.68,-1009.52 -470.03,-1017.62 -454.11,-1022.8 -437.49,-1024.86 -420.79,-1023.74 -404.6,-1019.48 -389.52,-1012.22 -376.08,-1002.23 -364.78,-989.88 -356.03,-975.61 -350.15,-959.93 -347.34,-943.43 -347.71,-926.69 -351.24,-910.33 -357.82,-894.93 -362.51,-888 -456.83,-888 -456.83,-887.9 -461.96,-887.63 -471.98,-885.51 -481.34,-881.35 -489.64,-875.35
Top Overlay:
  lines w10: -596.42,-1251.96 -596.42,1125.99 596.5,1125.99 596.5,-1251.96 -596.42,-1251.96
Top Solder:
  circle w8: c435,-937 r87.5
  circle w8: c-435,-937 r87.5
  region: 347.5,-937 347.5,-945.62 350.86,-962.52 357.46,-978.45 367.03,-992.78 379.22,-1004.97 393.55,-1014.54 409.48,-1021.14 426.38,-1024.5 435,-1024.5 443.62,-1024.5 460.52,-1021.14 476.45,-1014.54 490.78,-1004.97 502.97,-992.78 512.54,-978.45 519.14,-962.52 522.5,-945.62 522.5,-937 522.5,-928.38 519.14,-911.48 512.54,-895.55 502.97,-881.22 490.78,-869.03 476.45,-859.46 460.52,-852.86 443.62,-849.5 435,-849.5 426.38,-849.5 409.48,-852.86 393.55,-859.46 379.22,-869.03 367.03,-881.22 357.46,-895.55 350.86,-911.48 347.5,-928.38
  region: -522.5,-937 -522.5,-945.62 -519.14,-962.52 -512.54,-978.45 -502.97,-992.78 -490.78,-1004.97 -476.45,-1014.54 -460.52,-1021.14 -443.62,-1024.5 -435,-1024.5 -426.38,-1024.5 -409.48,-1021.14 -393.55,-1014.54 -379.22,-1004.97 -367.03,-992.78 -357.46,-978.45 -350.86,-962.52 -347.5,-945.62 -347.5,-937 -347.5,-928.38 -350.86,-911.48 -357.46,-895.55 -367.03,-881.22 -379.22,-869.03 -393.55,-859.46 -409.48,-852.86 -426.38,-849.5 -435,-849.5 -443.62,-849.5 -460.52,-852.86 -476.45,-859.46 -490.78,-869.03 -502.97,-881.22 -512.54,-895.55 -519.14,-911.48 -522.5,-928.38
Bottom Solder:
  circle w8: c435,-937 r87.5
  circle w8: c-435,-937 r87.5
  region: 522.5,-937 522.5,-945.62 519.14,-962.52 512.54,-978.45 502.97,-992.78 490.78,-1004.97 476.45,-1014.54 460.52,-1021.14 443.62,-1024.5 435,-1024.5 426.38,-1024.5 409.48,-1021.14 393.55,-1014.54 379.22,-1004.97 367.03,-992.78 357.46,-978.45 350.86,-962.52 347.5,-945.62 347.5,-937 347.5,-928.38 350.86,-911.48 357.46,-895.55 367.03,-881.22 379.22,-869.03 393.55,-859.46 409.48,-852.86 426.38,-849.5 435,-849.5 443.62,-849.5 460.52,-852.86 476.45,-859.46 490.78,-869.03 502.97,-881.22 512.54,-895.55 519.14,-911.48 522.5,-928.38
  region: -347.5,-937 -347.5,-945.62 -350.86,-962.52 -357.46,-978.45 -367.03,-992.78 -379.22,-1004.97 -393.55,-1014.54 -409.48,-1021.14 -426.38,-1024.5 -435,-1024.5 -443.62,-1024.5 -460.52,-1021.14 -476.45,-1014.54 -490.78,-1004.97 -502.97,-992.78 -512.54,-978.45 -519.14,-962.52 -522.5,-945.62 -522.5,-937 -522.5,-928.38 -519.14,-911.48 -512.54,-895.55 -502.97,-881.22 -490.78,-869.03 -476.45,-859.46 -460.52,-852.86 -443.62,-849.5 -435,-849.5 -426.38,-849.5 -409.48,-852.86 -393.55,-859.46 -379.22,-869.03 -367.03,-881.22 -357.46,-895.55 -350.86,-911.48 -347.5,-928.38
Keep-Out Layer:
  board cut-out: -456.83,-877.9 -460.69,-877.9 -468.26,-876.39 -475.39,-873.44 -481.8,-869.15 -487.26,-863.7 -491.54,-857.28 -494.49,-850.16 -496,-842.59 -496,-838.73 -496,-157.37 -496,-153.49 -494.49,-145.89 -491.52,-138.72 -487.21,-132.27 -481.73,-126.79 -475.28,-122.48 -468.11,-119.51 -460.51,-118 -456.63,-118 450.84,-118 454.7,-118 462.26,-119.5 469.39,-122.46 475.8,-126.74 481.26,-132.2 485.54,-138.61 488.49,-145.74 490,-153.3 490,-157.16 490,-838.84 490,-842.7 488.49,-850.26 485.54,-857.39 481.26,-863.8 475.8,-869.26 469.39,-873.54 462.26,-876.49 454.7,-878 450.84,-878
Mechanical 1:
  lines w5.91: -456.83,-877.9 cw(c-456.83,-838.73) -496,-838.73 -496,-157.37 cw(c-456.63,-157.37) -456.63,-118 450.84,-118 cw(c450.83,-157.16) 490,-157.16 490,-838.84 cw(c450.84,-838.83) 450.84,-878 -456.73,-878
  text "Cutout" at -151.54,-539.36 h60
Top Courtyard:
  lines w1.97: -608.23,-1263.77 -608.23,1137.8 608.31,1137.8 608.31,-1263.77 -608.23,-1263.77
  lines w3.94: -22.4,-3 15.4,-3 ; -3.5,-21.9 -3.5,15.9
3D body "NSL Eyestar-S4 Radio.STEP": height 706.99, standoff -107, extent -585.42,-1242.39 586.34,1116.63

## Eyestar 4 - No Silk [mil]
pads (4):
  oval 175x98 hole 96: F(-435,-937) F(435,-937)
  round 175 hole 96: F(-435,937) F(435,937)
Top Layer:
  region: -493.28,-871.73 -499.52,-877.31 -509.67,-890.62 -517.11,-905.62 -521.57,-921.76 -522.89,-938.45 -521.02,-955.08 -516.03,-971.06 -508.1,-985.81 -497.52,-998.78 -484.68,-1009.52 -470.03,-1017.62 -454.11,-1022.8 -437.49,-1024.86 -420.79,-1023.74 -404.6,-1019.48 -389.52,-1012.22 -376.08,-1002.23 -364.78,-989.88 -356.03,-975.61 -350.15,-959.93 -347.34,-943.43 -347.71,-926.69 -351.24,-910.33 -357.82,-894.93 -362.51,-888 -456.83,-888 -456.83,-887.9 -461.96,-887.63 -471.98,-885.51 -481.34,-881.35 -489.64,-875.35
  region: 362.51,-888 357.77,-895.01 351.15,-910.6 347.64,-927.16 347.38,-944.09 350.36,-960.76 356.49,-976.55 365.53,-990.86 377.14,-1003.18 390.9,-1013.05 406.3,-1020.09 422.76,-1024.05 439.68,-1024.78 456.42,-1022.26 472.37,-1016.57 486.93,-1007.93 499.56,-996.66 509.8,-983.18 517.27,-967.98 521.68,-951.63 522.88,-934.74 520.82,-917.94 515.57,-901.84 507.33,-887.04 496.42,-874.1 489.82,-868.8 486.14,-873.05 477.46,-880.17 467.39,-885.13 456.45,-887.68 450.84,-888
Bottom Layer:
  region: -493.28,-871.73 -499.52,-877.31 -509.67,-890.62 -517.11,-905.62 -521.57,-921.76 -522.89,-938.45 -521.02,-955.08 -516.03,-971.06 -508.1,-985.81 -497.52,-998.78 -484.68,-1009.52 -470.03,-1017.62 -454.11,-1022.8 -437.49,-1024.86 -420.79,-1023.74 -404.6,-1019.48 -389.52,-1012.22 -376.08,-1002.23 -364.78,-989.88 -356.03,-975.61 -350.15,-959.93 -347.34,-943.43 -347.71,-926.69 -351.24,-910.33 -357.82,-894.93 -362.51,-888 -456.83,-888 -456.83,-887.9 -461.96,-887.63 -471.98,-885.51 -481.34,-881.35 -489.64,-875.35
  region: 362.51,-888 357.77,-895.01 351.15,-910.6 347.64,-927.16 347.38,-944.09 350.36,-960.76 356.49,-976.55 365.53,-990.86 377.14,-1003.18 390.9,-1013.05 406.3,-1020.09 422.76,-1024.05 439.68,-1024.78 456.42,-1022.26 472.37,-1016.57 486.93,-1007.93 499.56,-996.66 509.8,-983.18 517.27,-967.98 521.68,-951.63 522.88,-934.74 520.82,-917.94 515.57,-901.84 507.33,-887.04 496.42,-874.1 489.82,-868.8 486.14,-873.05 477.46,-880.17 467.39,-885.13 456.45,-887.68 450.84,-888
Top Solder:
  circle w8: c-435,-937 r87.5
  circle w8: c435,-937 r87.5
  region: -522.5,-937 -522.5,-945.62 -519.14,-962.52 -512.54,-978.45 -502.97,-992.78 -490.78,-1004.97 -476.45,-1014.54 -460.52,-1021.14 -443.62,-1024.5 -435,-1024.5 -426.38,-1024.5 -409.48,-1021.14 -393.55,-1014.54 -379.22,-1004.97 -367.03,-992.78 -357.46,-978.45 -350.86,-962.52 -347.5,-945.62 -347.5,-937 -347.5,-928.38 -350.86,-911.48 -357.46,-895.55 -367.03,-881.22 -379.22,-869.03 -393.55,-859.46 -409.48,-852.86 -426.38,-849.5 -435,-849.5 -443.62,-849.5 -460.52,-852.86 -476.45,-859.46 -490.78,-869.03 -502.97,-881.22 -512.54,-895.55 -519.14,-911.48 -522.5,-928.38
  region: 347.5,-937 347.5,-945.62 350.86,-962.52 357.46,-978.45 367.03,-992.78 379.22,-1004.97 393.55,-1014.54 409.48,-1021.14 426.38,-1024.5 435,-1024.5 443.62,-1024.5 460.52,-1021.14 476.45,-1014.54 490.78,-1004.97 502.97,-992.78 512.54,-978.45 519.14,-962.52 522.5,-945.62 522.5,-937 522.5,-928.38 519.14,-911.48 512.54,-895.55 502.97,-881.22 490.78,-869.03 476.45,-859.46 460.52,-852.86 443.62,-849.5 435,-849.5 426.38,-849.5 409.48,-852.86 393.55,-859.46 379.22,-869.03 367.03,-881.22 357.46,-895.55 350.86,-911.48 347.5,-928.38
Bottom Solder:
  circle w8: c-435,-937 r87.5
  circle w8: c435,-937 r87.5
  region: -347.5,-937 -347.5,-945.62 -350.86,-962.52 -357.46,-978.45 -367.03,-992.78 -379.22,-1004.97 -393.55,-1014.54 -409.48,-1021.14 -426.38,-1024.5 -435,-1024.5 -443.62,-1024.5 -460.52,-1021.14 -476.45,-1014.54 -490.78,-1004.97 -502.97,-992.78 -512.54,-978.45 -519.14,-962.52 -522.5,-945.62 -522.5,-937 -522.5,-928.38 -519.14,-911.48 -512.54,-895.55 -502.97,-881.22 -490.78,-869.03 -476.45,-859.46 -460.52,-852.86 -443.62,-849.5 -435,-849.5 -426.38,-849.5 -409.48,-852.86 -393.55,-859.46 -379.22,-869.03 -367.03,-881.22 -357.46,-895.55 -350.86,-911.48 -347.5,-928.38
  region: 522.5,-937 522.5,-945.62 519.14,-962.52 512.54,-978.45 502.97,-992.78 490.78,-1004.97 476.45,-1014.54 460.52,-1021.14 443.62,-1024.5 435,-1024.5 426.38,-1024.5 409.48,-1021.14 393.55,-1014.54 379.22,-1004.97 367.03,-992.78 357.46,-978.45 350.86,-962.52 347.5,-945.62 347.5,-937 347.5,-928.38 350.86,-911.48 357.46,-895.55 367.03,-881.22 379.22,-869.03 393.55,-859.46 409.48,-852.86 426.38,-849.5 435,-849.5 443.62,-849.5 460.52,-852.86 476.45,-859.46 490.78,-869.03 502.97,-881.22 512.54,-895.55 519.14,-911.48 522.5,-928.38
Keep-Out Layer:
  board cut-out: -456.83,-877.9 -460.69,-877.9 -468.26,-876.39 -475.39,-873.44 -481.8,-869.15 -487.26,-863.7 -491.54,-857.28 -494.49,-850.16 -496,-842.59 -496,-838.73 -496,-157.37 -496,-153.49 -494.49,-145.89 -491.52,-138.72 -487.21,-132.27 -481.73,-126.79 -475.28,-122.48 -468.11,-119.51 -460.51,-118 -456.63,-118 450.84,-118 454.7,-118 462.26,-119.5 469.39,-122.46 475.8,-126.74 481.26,-132.2 485.54,-138.61 488.49,-145.74 490,-153.3 490,-157.16 490,-838.84 490,-842.7 488.49,-850.26 485.54,-857.39 481.26,-863.8 475.8,-869.26 469.39,-873.54 462.26,-876.49 454.7,-878 450.84,-878
Mechanical 1:
  lines w5.91: -456.83,-877.9 cw(c-456.83,-838.73) -496,-838.73 -496,-157.37 cw(c-456.63,-157.37) -456.63,-118 450.84,-118 cw(c450.83,-157.16) 490,-157.16 490,-838.84 cw(c450.84,-838.83) 450.84,-878 -456.73,-878
  text "Cutout" at -151.54,-539.36 h60
Top 3D Body:
  lines w10: -596.42,-1251.96 -596.42,1125.99 596.5,1125.99 596.5,-1251.96 -596.42,-1251.96
Top Courtyard:
  lines w1.97: -608.23,-1263.77 608.31,-1263.77 608.31,1137.8 -608.23,1137.8 -608.23,-1263.77
  lines w3.94: -22.4,-3 15.4,-3 ; -3.5,-21.9 -3.5,15.9
3D body "NSL Eyestar-S4 Radio.STEP": height 706.99, standoff -107, extent -585.42,-1242.39 586.34,1116.63

## FQ Crystal [mm]
pads (4):
  rect 1.4x1.2 smd mask+0.076: 1(-1.1,-0.8) 3(1.1,0.8) F(-1.1,0.8) F(1.1,-0.8)
Top Overlay:
  lines w0.254: -2.05,-1.65 2.05,-1.65 2.05,1.65 -2.05,1.65 -2.05,-1.65
Top Courtyard:
  lines w0.05: -2.4,-2 -2.4,2 2.4,2 2.4,-2 -2.4,-2
  lines w0.1: -0.48,0 0.48,0 ; 0,-0.48 0,0.48
3D body: height 0.7, standoff 0, extent -1.6,-1.25 1.6,1.25
3D body: height 0.75, standoff 0.7, extent -1.475,-1.125 1.475,1.125

## GS Simplex [mil]
pads (4):
  round 150 hole 96: F(-431.5,-934) F(-431.5,934) F(431.5,-934) F(431.5,934)
Top Overlay:
  lines w10: -518.11,-1180.17 521.26,-1180.17 521.26,1020.61 -518.11,1020.61 -518.11,-1180.17
Keep-Out Layer:
  board cut-out: -372.5,-381 -372.5,669 -372.5,673.92 -370.58,683.58 -366.81,692.68 -361.34,700.87 -354.37,707.84 -346.18,713.31 -337.08,717.08 -327.42,719 -322.5,719 427.5,719 432.42,719 442.08,717.08 451.18,713.31 459.37,707.84 466.34,700.87 471.81,692.68 475.58,683.58 477.5,673.92 477.5,669 477.5,-381 477.5,-385.92 475.58,-395.58 471.81,-404.68 466.34,-412.87 459.37,-419.84 451.18,-425.31 442.08,-429.08 432.42,-431 427.5,-431 -322.5,-431 -327.42,-431 -337.08,-429.08 -346.18,-425.31 -354.37,-419.84 -361.34,-412.87 -366.81,-404.68 -370.58,-395.58 -372.5,-385.92
Mechanical 1:
  lines w10: -372.5,-381 ccw(c-322.5,-381) -322.5,-431 -298.5,-431 401.5,-431 427.5,-431 ccw(c427.5,-381) 477.5,-381 477.5,-356 477.5,644 477.5,669 ccw(c427.5,669) 427.5,719 401.5,719 -298.5,719 -322.5,719 ccw(c-322.5,669) -372.5,669 -372.5,644 -372.5,-356 -372.5,-381
  text "Cutout" at -91.5,134 h60
Mechanical 5:
  circle w10: c-287.8,-967.58 r17.74
  circle w10: c-321.26,-1113.24 r17.61
Top Courtyard:
  lines w1.97: -531.5,-1188.98 531.5,-1188.98 531.5,1031.5 -531.5,1031.5 -531.5,-1188.98
  lines w3.94: -18.9,0 18.9,0 ; 0,-18.9 0,18.9
3D body "NSL EyeStar-S3.STEP": height 520.9, standoff -33.73, extent -502.47,-1160.67 501.47,1004.68